# Altium schematic symbol library LATTICEPLDS_Library.SchLib: 291 symbols (part 22 of 32)
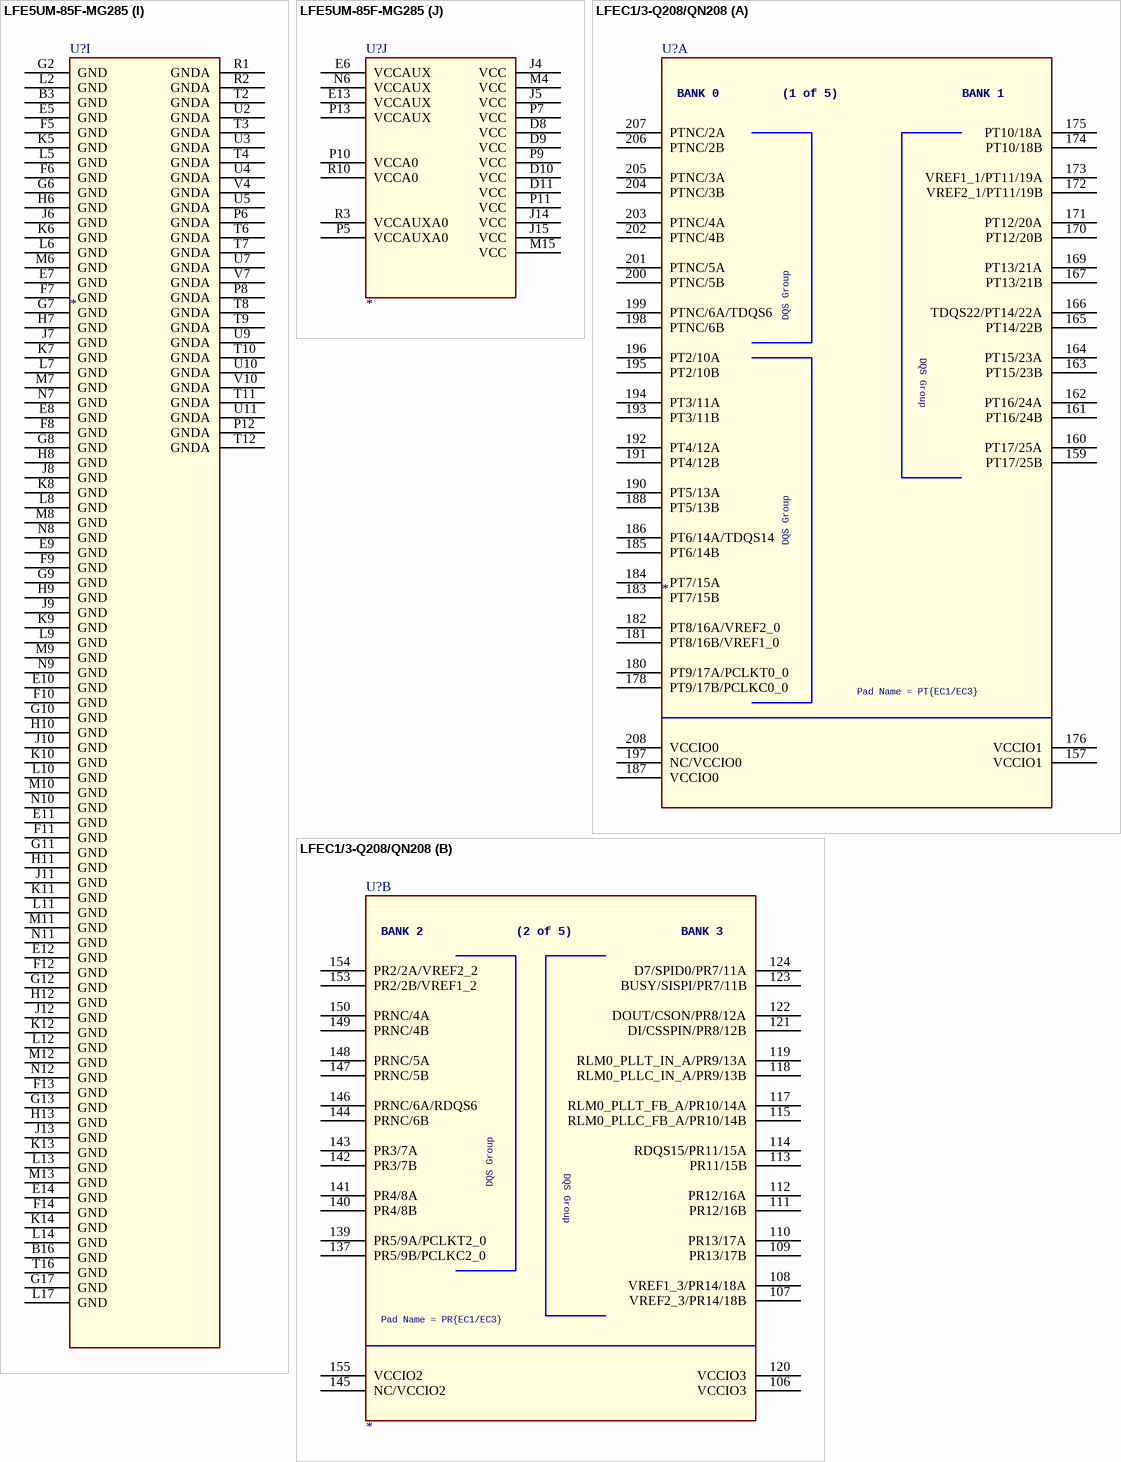
[diagram p324: symbols LFE5UM-85F-MG285 to LFEC1/3-Q208/QN208]

## LFE5UM-85F-MG285
designator U?
SPLIT_INST: TRUE; SWAP_INFO: (S1+S2+S3+S4+S5+S6+S7+S8+S9+S10)
part A pins: A10 PT63B/PCLKC0_1 (io), A11 PT63A/PCLKT0_1 (io), B10 PT65A/PCLKT0_0 (io), B11 PT4A/ULC_GPLL1T_IN (io), C10 PT65B/PCLKC0_0 (io), C11 PT4B/ULC_GPLL1C_IN (io), D12 VCCIO0 (power)
part B pins: A8 PT71B/PCLKC1_0 (io), A9 PT71A/PCLKT1_0 (io), B8 PT121A/URC_GPLL1T_IN (io), B9 PT69A/PCLKT1_1 (io), C8 PT121B/URC_GPLL1C_IN (io), C9 PT69B/PCLKC1_1 (io), D7 VCCIO1 (power)
part C pins: A2 PR41C (io), A3 PR41A (io), A4 PR20B (io), A6 PR20A (io), A7 PR17B (io), B1 PR44B/PCLKC2_1 (io), B2 PR41B (io), B4 PR35C/VREF1_2 (io), B6 PR17A (io), B7 PR11B/URC_GPLL0C_IN (io), C1 PR44C/PCLKT2_0 (io), C2 PR38B (io), C3 PR35D (io), C4 PR35B (io), C6 PR14B (io), C7 PR11A/URC_GPLL0T_IN (io), D1 PR44D/PCLKC2_0 (io), D2 PR44A/PCLKT2_1 (io), D3 PR38A (io), D4 PR35A (io), D6 PR14A (io), G5 VCCIO2 (power), H5 VCCIO2 (power)
part D pins: F1 PR56C (io), F2 PR53A (io), F3 PR47D/PCLKC3_0 (io), F4 PR47C/PCLKT3_0 (io), G1 PR53B (io), G3 PR50B (io), G4 PR47B/PCLKC3_1 (io), H1 PR56D (io), H2 PR50D (io), H3 PR50A (io), H4 PR47A/PCLKT3_1 (io), J1 PR56B/VREF1_3 (io), J2 PR56A (io), J3 PR50C (io), K1 PR86D (io), K2 PR89A (io), K3 PR86C (io), K4 PR83A (io), L1 PR89B (io), L3 PR86B (io), L4 PR83B (io), M1 PR92C/LRC_GPLL0T_IN (io), M2 PR89C (io), M3 PR86A (io), M5 VCCIO3 (power), N1 PR92D/LRC_GPLL0C_IN (io), N2 PR89D (io), N3 PR83D (io), N4 PR83C (io), N5 VCCIO3 (power)
part E pins: C18 PL47B/PCLKC6_1 (io), D17 PL47A/PCLKT6_1 (io), D18 PL47C/PCLKT6_0 (io), F15 PL50C (io), F16 PL50B (io), F17 PL50A (io), F18 PL47D/PCLKC6_0 (io), G15 PL56A (io), G16 PL50D (io), G18 PL53A (io), H15 PL56B/VREF1_6 (io), H16 PL56C (io), H17 PL53B (io), H18 PL83D (io), J16 PL56D (io), J17 PL83C (io), J18 PL86A (io), K15 PL86D (io), K16 PL86C (io), K17 PL89A (io), K18 PL86B (io), L15 PL89C (io), L16 PL89D (io), L18 PL89B (io), M14 VCCIO6 (power), M16 PL92C/LLC_GPLL0T_IN (io), M17 PL92D/LLC_GPLL0C_IN (io), N14 VCCIO6 (power)
part F pins: A12 PL14A (io), A13 PL35B (io), A15 PL35D (io), A16 PL41B (io), A17 PL44A/PCLKT7_1 (io), B12 PL11B (io), B13 PL35A (io), B15 PL41A (io), B17 PL44B/PCLKC7_1 (io), B18 PL44C/PCLKT7_0 (io), C12 PL11A (io), C13 PL17B (io), C15 PL35C/VREF1_7 (io), C16 PL41C (io), C17 PL44D/PCLKC7_0 (io), D13 PL17A (io), D15 PL38A (io), D16 PL38B (io), G14 VCCIO7 (power), H14 VCCIO7 (power)
part G pins: M18 PB6B/D4 (io), N13 VCCIO8 (power), N15 PB4A/D7 (io), N16 PB4B/D6 (io), N17 PB6A/D5 (io), N18 PB9A/D3/IO3 (io), P14 VCCIO8 (power), R16 PB18A/WRITEN (io), R17 PB13A/SN/CSN (io), R18 PB9B/D2/IO2 (io), T13 TDI (io), T14 CFG_1 (io), T15 PROGRAMN (io), T17 PB13B/CS1N (io), T18 PB11A/D1/MISO/IO1 (io), U13 TCK (io), U14 CFG_0 (io), U15 DONE (io), U16 CCLK/MCLK/SCK (io), U17 PB15A/HOLDN/DI/BUSY/CSSPIN/CEN (io), U18 PB11B/D0/MOSI/IO0 (io), V13 TMS (io), V14 TDO (io), V15 CFG_2 (io), V16 INITN (io), V17 PB15B/DOUT/CSON (io)
part H pins: T1 REFCLKN_D0 (power), T5 VCCHTX1_D0CH1 (power), U1 REFCLKP_D0 (power), U6 VCCHRX1_D0CH1 (power), U8 VCCHRX0_D0CH0 (power), U12 VCCHTX0_D0CH0 (power), V2 HDTXN0_D0CH1 (power), V3 HDTXP0_D0CH1 (power), V5 HDRXN0_D0CH1 (power), V6 HDRXP0_D0CH1 (power), V8 HDRXN0_D0CH0 (power), V9 HDRXP0_D0CH0 (power), V11 HDTXN0_D0CH0 (power), V12 HDTXP0_D0CH0 (power)
part I pins: B3 GND (power), B16 GND (power), E5 GND (power), E7 GND (power), E8 GND (power), E9 GND (power), E10 GND (power), E11 GND (power), E12 GND (power), E14 GND (power), F5 GND (power), F6 GND (power), F7 GND (power), F8 GND (power), F9 GND (power), F10 GND (power), F11 GND (power), F12 GND (power), F13 GND (power), F14 GND (power), G2 GND (power), G6 GND (power), G7 GND (power), G8 GND (power), G9 GND (power), G10 GND (power), G11 GND (power), G12 GND (power), G13 GND (power), G17 GND (power), H6 GND (power), H7 GND (power), H8 GND (power), H9 GND (power), H10 GND (power), H11 GND (power), H12 GND (power), H13 GND (power), J6 GND (power), J7 GND (power), J8 GND (power), J9 GND (power), J10 GND (power), J11 GND (power), J12 GND (power), J13 GND (power), K5 GND (power), K6 GND (power), K7 GND (power), K8 GND (power), K9 GND (power), K10 GND (power), K11 GND (power), K12 GND (power), K13 GND (power), K14 GND (power), L2 GND (power), L5 GND (power), L6 GND (power), L7 GND (power), L8 GND (power), L9 GND (power), L10 GND (power), L11 GND (power), L12 GND (power), L13 GND (power), L14 GND (power), L17 GND (power), M6 GND (power), M7 GND (power), M8 GND (power), M9 GND (power), M10 GND (power), M11 GND (power), M12 GND (power), M13 GND (power), N7 GND (power), N8 GND (power), N9 GND (power), N10 GND (power), N11 GND (power), N12 GND (power), P6 GNDA (power), P8 GNDA (power), P12 GNDA (power), R1 GNDA (power), R2 GNDA (power), T2 GNDA (power), T3 GNDA (power), T4 GNDA (power), T6 GNDA (power), T7 GNDA (power), T8 GNDA (power), T9 GNDA (power), T10 GNDA (power), T11 GNDA (power), T12 GNDA (power), T16 GND (power), U2 GNDA (power), U3 GNDA (power), U4 GNDA (power), U5 GNDA (power), U7 GNDA (power), U9 GNDA (power), U10 GNDA (power), U11 GNDA (power), V4 GNDA (power), V7 GNDA (power), V10 GNDA (power)
part J pins: D8 VCC (power), D9 VCC (power), D10 VCC (power), D11 VCC (power), E6 VCCAUX (power), E13 VCCAUX (power), J4 VCC (power), J5 VCC (power), J14 VCC (power), J15 VCC (power), M4 VCC (power), M15 VCC (power), N6 VCCAUX (power), P5 VCCAUXA0 (power), P7 VCC (power), P9 VCC (power), P10 VCCA0 (power), P11 VCC (power), P13 VCCAUX (power), R3 VCCAUXA0 (power), R10 VCCA0 (power)

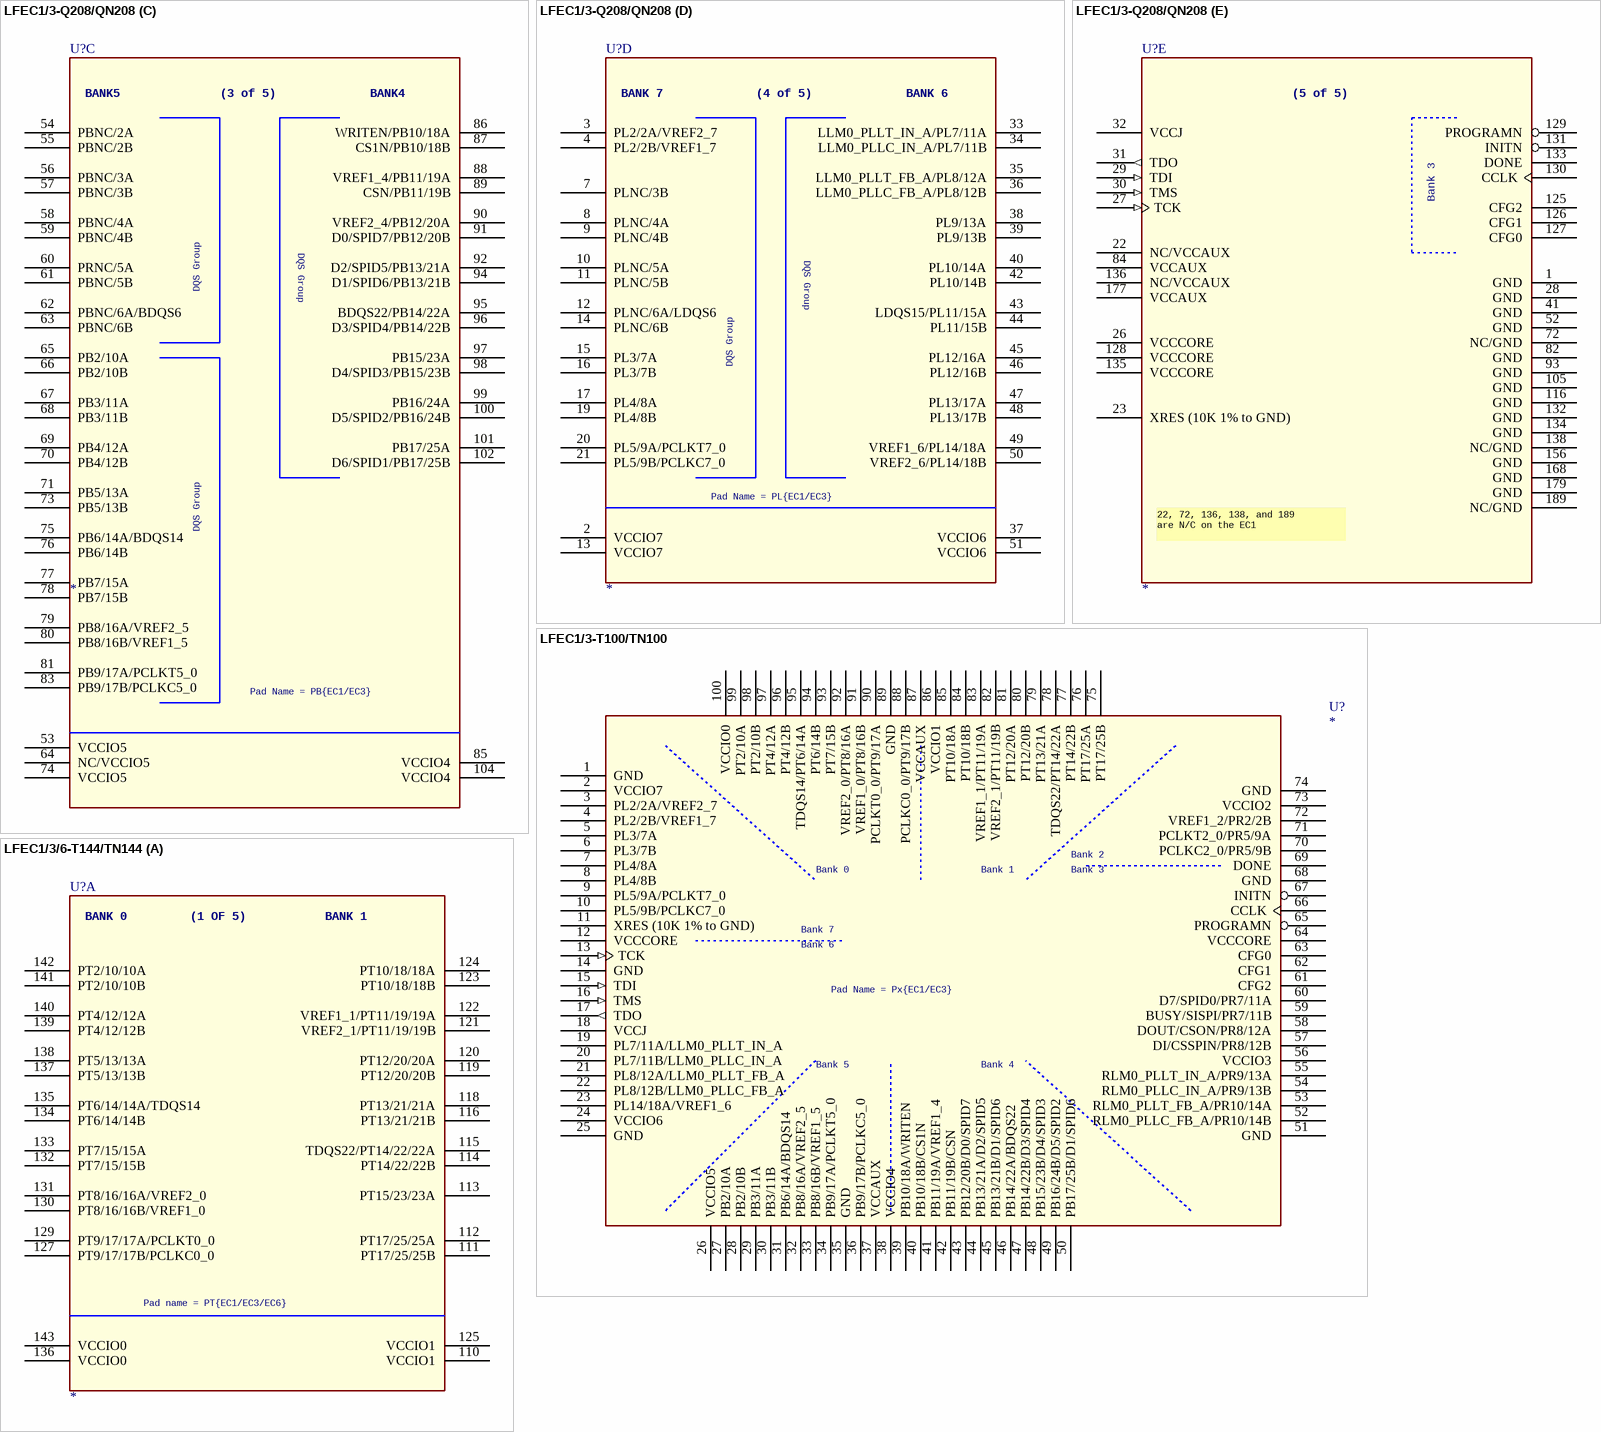
[diagram p206: symbols LFEC1/3-Q208/QN208 to LFEC1/3/6-T144/TN144]

## LFEC1/3-Q208/QN208
designator U?
footprint 208PQFP
part A pins: 157 VCCIO1 (power), 159 PT17/25B, 160 PT17/25A, 161 PT16/24B, 162 PT16/24A, 163 PT15/23B, 164 PT15/23A, 165 PT14/22B, 166 TDQS22/PT14/22A, 167 PT13/21B, 169 PT13/21A, 170 PT12/20B, 171 PT12/20A, 172 VREF2_1/PT11/19B, 173 VREF1_1/PT11/19A, 174 PT10/18B, 175 PT10/18A, 176 VCCIO1 (power), 178 PT9/17B/PCLKC0_0, 180 PT9/17A/PCLKT0_0, 181 PT8/16B/VREF1_0, 182 PT8/16A/VREF2_0, 183 PT7/15B, 184 PT7/15A, 185 PT6/14B, 186 PT6/14A/TDQS14, 187 VCCIO0 (power), 188 PT5/13B, 190 PT5/13A, 191 PT4/12B, 192 PT4/12A, 193 PT3/11B, 194 PT3/11A, 195 PT2/10B, 196 PT2/10A, 197 NC/VCCIO0 (power), 198 PTNC/6B, 199 PTNC/6A/TDQS6, 200 PTNC/5B, 201 PTNC/5A, 202 PTNC/4B, 203 PTNC/4A, 204 PTNC/3B, 205 PTNC/3A, 206 PTNC/2B, 207 PTNC/2A, 208 VCCIO0 (power)
part B pins: 106 VCCIO3 (power), 107 VREF2_3/PR14/18B, 108 VREF1_3/PR14/18A, 109 PR13/17B, 110 PR13/17A, 111 PR12/16B, 112 PR12/16A, 113 PR11/15B, 114 RDQS15/PR11/15A, 115 RLM0_PLLC_FB_A/PR10/14B, 117 RLM0_PLLT_FB_A/PR10/14A, 118 RLM0_PLLC_IN_A/PR9/13B, 119 RLM0_PLLT_IN_A/PR9/13A, 120 VCCIO3 (power), 121 DI/CSSPIN/PR8/12B, 122 DOUT/CSON/PR8/12A, 123 BUSY/SISPI/PR7/11B, 124 D7/SPID0/PR7/11A, 137 PR5/9B/PCLKC2_0, 139 PR5/9A/PCLKT2_0, 140 PR4/8B, 141 PR4/8A, 142 PR3/7B, 143 PR3/7A, 144 PRNC/6B, 145 NC/VCCIO2 (power), 146 PRNC/6A/RDQS6, 147 PRNC/5B, 148 PRNC/5A, 149 PRNC/4B, 150 PRNC/4A, 153 PR2/2B/VREF1_2, 154 PR2/2A/VREF2_2, 155 VCCIO2 (power)
part C pins: 53 VCCIO5 (power), 54 PBNC/2A, 55 PBNC/2B, 56 PBNC/3A, 57 PBNC/3B, 58 PBNC/4A, 59 PBNC/4B, 60 PRNC/5A, 61 PBNC/5B, 62 PBNC/6A/BDQS6, 63 PBNC/6B, 64 NC/VCCIO5 (power), 65 PB2/10A, 66 PB2/10B, 67 PB3/11A, 68 PB3/11B, 69 PB4/12A, 70 PB4/12B, 71 PB5/13A, 73 PB5/13B, 74 VCCIO5 (power), 75 PB6/14A/BDQS14, 76 PB6/14B, 77 PB7/15A, 78 PB7/15B, 79 PB8/16A/VREF2_5, 80 PB8/16B/VREF1_5, 81 PB9/17A/PCLKT5_0, 83 PB9/17B/PCLKC5_0, 85 VCCIO4 (power), 86 WRITEN/PB10/18A, 87 CS1N/PB10/18B, 88 VREF1_4/PB11/19A, 89 CSN/PB11/19B, 90 VREF2_4/PB12/20A, 91 D0/SPID7/PB12/20B, 92 D2/SPID5/PB13/21A, 94 D1/SPID6/PB13/21B, 95 BDQS22/PB14/22A, 96 D3/SPID4/PB14/22B, 97 PB15/23A, 98 D4/SPID3/PB15/23B, 99 PB16/24A, 100 D5/SPID2/PB16/24B, 101 PB17/25A, 102 D6/SPID1/PB17/25B, 104 VCCIO4 (power)
part D pins: 2 VCCIO7 (power), 3 PL2/2A/VREF2_7, 4 PL2/2B/VREF1_7, 7 PLNC/3B, 8 PLNC/4A, 9 PLNC/4B, 10 PLNC/5A, 11 PLNC/5B, 12 PLNC/6A/LDQS6, 13 VCCIO7 (power), 14 PLNC/6B, 15 PL3/7A, 16 PL3/7B, 17 PL4/8A, 19 PL4/8B, 20 PL5/9A/PCLKT7_0, 21 PL5/9B/PCLKC7_0, 33 LLM0_PLLT_IN_A/PL7/11A, 34 LLM0_PLLC_IN_A/PL7/11B, 35 LLM0_PLLT_FB_A/PL8/12A, 36 LLM0_PLLC_FB_A/PL8/12B, 37 VCCIO6 (power), 38 PL9/13A, 39 PL9/13B, 40 PL10/14A, 42 PL10/14B, 43 LDQS15/PL11/15A, 44 PL11/15B, 45 PL12/16A, 46 PL12/16B, 47 PL13/17A, 48 PL13/17B, 49 VREF1_6/PL14/18A, 50 VREF2_6/PL14/18B, 51 VCCIO6 (power)
part E pins: 1 GND (power), 22 NC/VCCAUX (power), 23 XRES (10K 1% to GND), 26 VCCCORE (power), 27 TCK (in), 28 GND (power), 29 TDI (in), 30 TMS (in), 31 TDO (out), 32 VCCJ (power), 41 GND (power), 52 GND (power), 72 NC/GND (power), 82 GND (power), 84 VCCAUX (power), 93 GND (power), 105 GND (power), 116 GND (power), 125 CFG2, 126 CFG1, 127 CFG0, 128 VCCCORE (power), 129 PROGRAMN, 130 CCLK, 131 INITN, 132 GND (power), 133 DONE, 134 GND (power), 135 VCCCORE (power), 136 NC/VCCAUX (power), 138 NC/GND (power), 156 GND (power), 168 GND (power), 177 VCCAUX (power), 179 GND (power), 189 NC/GND (power)
part A text: BANK 0; (1 of 5); BANK 1; DQS Group; Pad Name = PT{EC1/EC3}
part B text: BANK 2; (2 of 5); BANK 3; DQS Group; Pad Name = PR{EC1/EC3}
part C text: BANK5; (3 of 5); BANK4; DQS Group; Pad Name = PB{EC1/EC3}
part D text: BANK 7; (4 of 5); BANK 6; DQS Group; Pad Name = PL{EC1/EC3}
part E text: (5 of 5); Bank 3; 22, 72, 136, 138, and 189 / are N/C on the EC1

## LFEC1/3-T100/TN100
designator U?
footprint TQFP100
pins: 1 GND (power), 2 VCCIO7 (power), 3 PL2/2A/VREF2_7, 4 PL2/2B/VREF1_7, 5 PL3/7A, 6 PL3/7B, 7 PL4/8A, 8 PL4/8B, 9 PL5/9A/PCLKT7_0, 10 PL5/9B/PCLKC7_0, 11 XRES (10K 1% to GND), 12 VCCCORE (power), 13 TCK (in), 14 GND (power), 15 TDI (in), 16 TMS (in), 17 TDO (out), 18 VCCJ (power), 19 PL7/11A/LLM0_PLLT_IN_A, 20 PL7/11B/LLM0_PLLC_IN_A, 21 PL8/12A/LLM0_PLLT_FB_A, 22 PL8/12B/LLM0_PLLC_FB_A, 23 PL14/18A/VREF1_6, 24 VCCIO6 (power), 25 GND (power), 26 VCCIO5 (power), 27 PB2/10A, 28 PB2/10B, 29 PB3/11A, 30 PB3/11B, 31 PB6/14A/BDQS14, 32 PB8/16A/VREF2_5, 33 PB8/16B/VREF1_5, 34 PB9/17A/PCLKT5_0, 35 GND (power), 36 PB9/17B/PCLKC5_0, 37 VCCAUX (power), 38 VCCIO4 (power), 39 PB10/18A/WRITEN, 40 PB10/18B/CS1N, 41 PB11/19A/VREF1_4, 42 PB11/19B/CSN, 43 PB12/20B/D0/SPID7, 44 PB13/21A/D2/SPID5, 45 PB13/21B/D1/SPID6, 46 PB14/22A/BDQS22, 47 PB14/22B/D3/SPID4, 48 PB15/23B/D4/SPID3, 49 PB16/24B/D5/SPID2, 50 PB17/25B/D1/SPID6, 51 GND (power), 52 RLM0_PLLC_FB_A/PR10/14B, 53 RLM0_PLLT_FB_A/PR10/14A, 54 RLM0_PLLC_IN_A/PR9/13B, 55 RLM0_PLLT_IN_A/PR9/13A, 56 VCCIO3 (power), 57 DI/CSSPIN/PR8/12B, 58 DOUT/CSON/PR8/12A, 59 BUSY/SISPI/PR7/11B, 60 D7/SPID0/PR7/11A, 61 CFG2, 62 CFG1, 63 CFG0, 64 VCCCORE (power), 65 PROGRAMN, 66 CCLK, 67 INITN, 68 GND (power), 69 DONE, 70 PCLKC2_0/PR5/9B, 71 PCLKT2_0/PR5/9A, 72 VREF1_2/PR2/2B, 73 VCCIO2 (power), 74 GND (power), 75 PT17/25B, 76 PT17/25A, 77 PT14/22B, 78 TDQS22/PT14/22A, 79 PT13/21A, 80 PT12/20B, 81 PT12/20A, 82 VREF2_1/PT11/19B, 83 VREF1_1/PT11/19A, 84 PT10/18B, 85 PT10/18A, 86 VCCIO1 (power), 87 VCCAUX (power), 88 PCLKC0_0/PT9/17B, 89 GND (power), 90 PCLKT0_0/PT9/17A, 91 VREF1_0/PT8/16B, 92 VREF2_0/PT8/16A, 93 PT7/15B, 94 PT6/14B, 95 TDQS14/PT6/14A, 96 PT4/12B, 97 PT4/12A, 98 PT2/10B, 99 PT2/10A, 100 VCCIO0 (power)
text: Bank 2; Bank 0; Bank 1; Bank 3; Bank 7; Bank 6; Pad Name = Px{EC1/EC3}; Bank 5; Bank 4

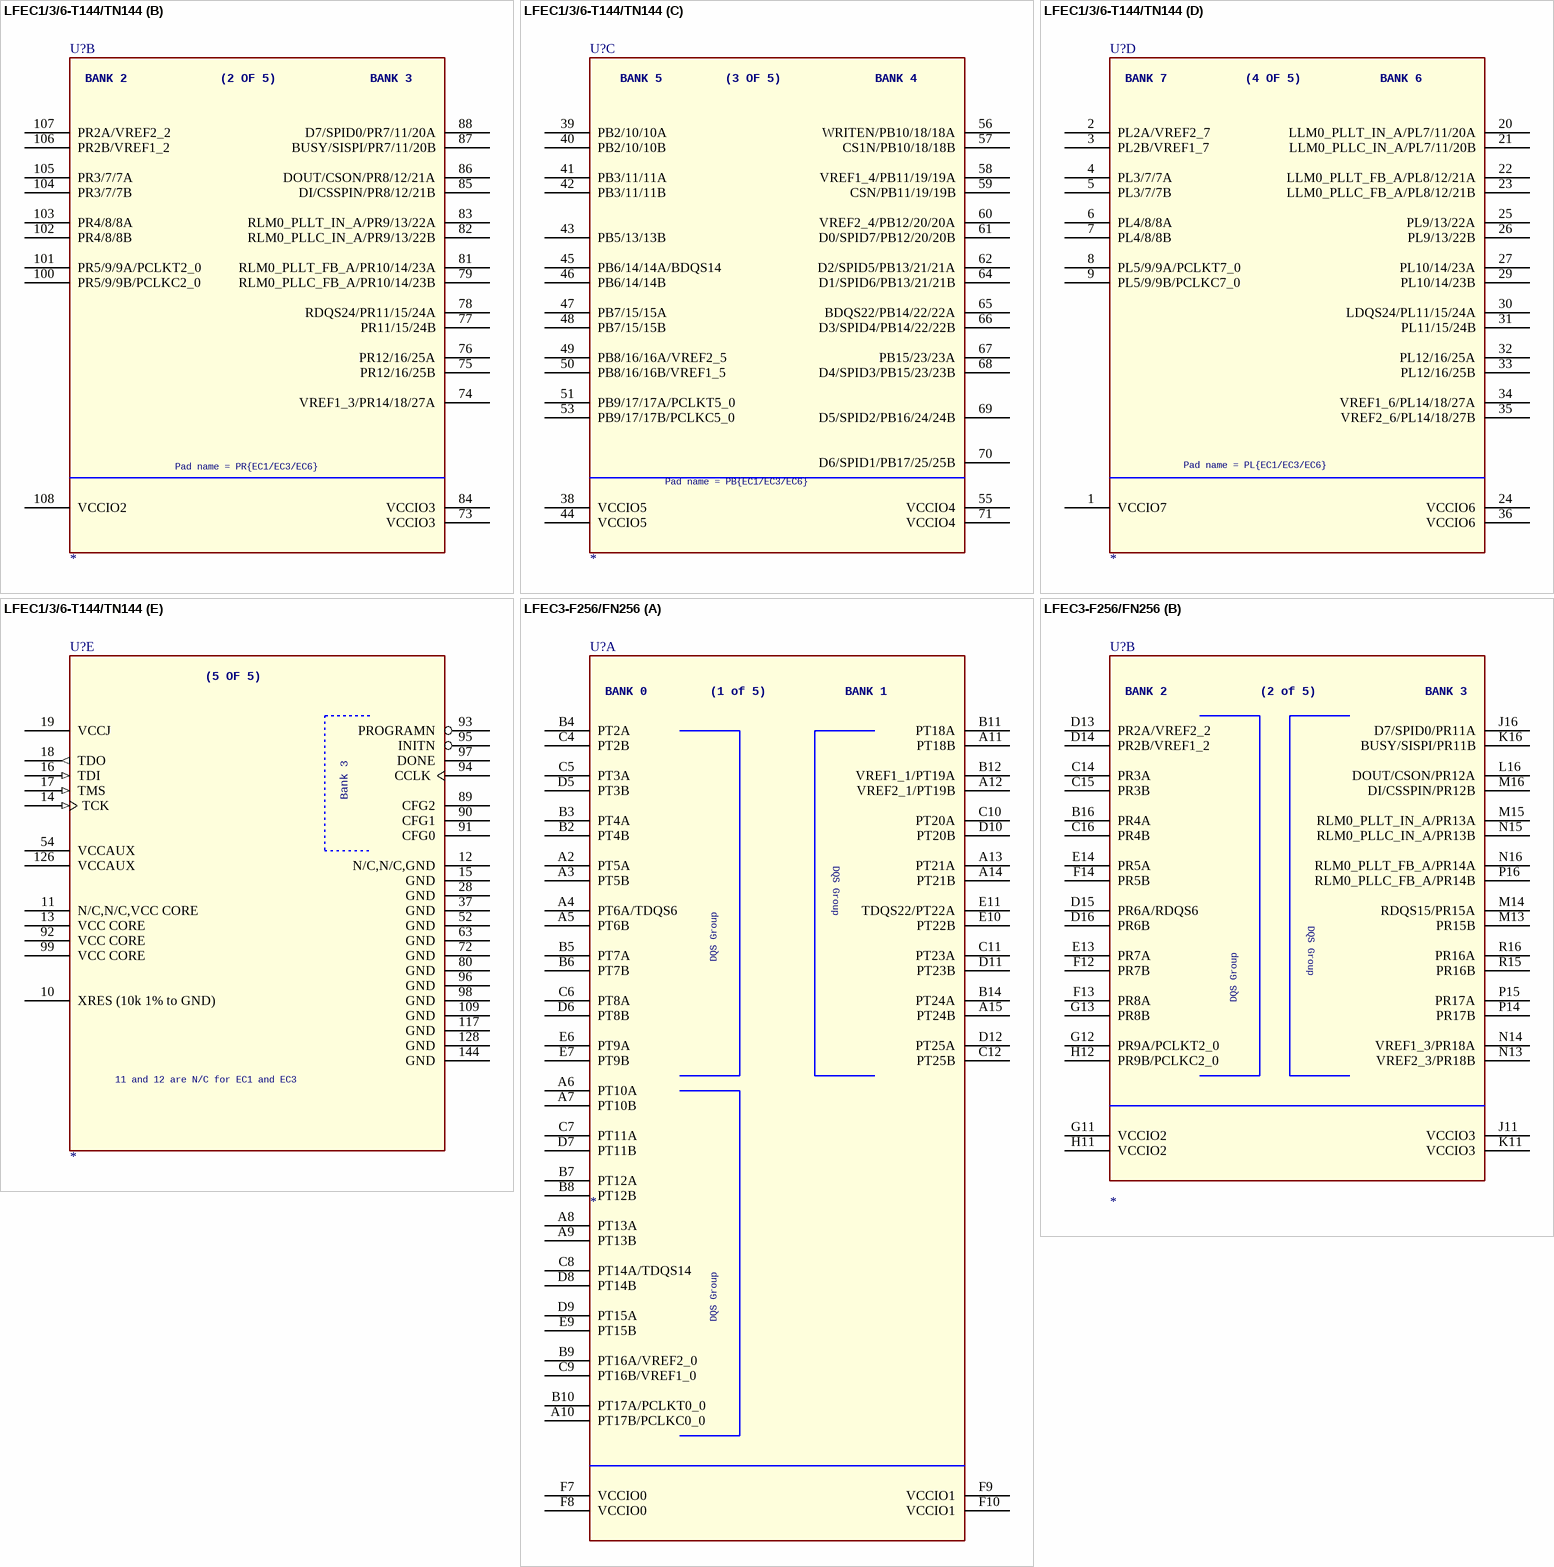
[diagram p207: symbols LFEC1/3/6-T144/TN144 to LFEC3-F256/FN256]

## LFEC1/3/6-T144/TN144
designator U?
footprint TQFP144
part A pins: 110 VCCIO1 (power), 111 PT17/25/25B, 112 PT17/25/25A, 113 PT15/23/23A, 114 PT14/22/22B, 115 TDQS22/PT14/22/22A, 116 PT13/21/21B, 118 PT13/21/21A, 119 PT12/20/20B, 120 PT12/20/20A, 121 VREF2_1/PT11/19/19B, 122 VREF1_1/PT11/19/19A, 123 PT10/18/18B, 124 PT10/18/18A, 125 VCCIO1 (power), 127 PT9/17/17B/PCLKC0_0, 129 PT9/17/17A/PCLKT0_0, 130 PT8/16/16B/VREF1_0, 131 PT8/16/16A/VREF2_0, 132 PT7/15/15B, 133 PT7/15/15A, 134 PT6/14/14B, 135 PT6/14/14A/TDQS14, 136 VCCIO0 (power), 137 PT5/13/13B, 138 PT5/13/13A, 139 PT4/12/12B, 140 PT4/12/12A, 141 PT2/10/10B, 142 PT2/10/10A, 143 VCCIO0 (power)
part B pins: 73 VCCIO3 (power), 74 VREF1_3/PR14/18/27A, 75 PR12/16/25B, 76 PR12/16/25A, 77 PR11/15/24B, 78 RDQS24/PR11/15/24A, 79 RLM0_PLLC_FB_A/PR10/14/23B, 81 RLM0_PLLT_FB_A/PR10/14/23A, 82 RLM0_PLLC_IN_A/PR9/13/22B, 83 RLM0_PLLT_IN_A/PR9/13/22A, 84 VCCIO3 (power), 85 DI/CSSPIN/PR8/12/21B, 86 DOUT/CSON/PR8/12/21A, 87 BUSY/SISPI/PR7/11/20B, 88 D7/SPID0/PR7/11/20A, 100 PR5/9/9B/PCLKC2_0, 101 PR5/9/9A/PCLKT2_0, 102 PR4/8/8B, 103 PR4/8/8A, 104 PR3/7/7B, 105 PR3/7/7A, 106 PR2B/VREF1_2, 107 PR2A/VREF2_2, 108 VCCIO2 (power)
part C pins: 38 VCCIO5 (power), 39 PB2/10/10A, 40 PB2/10/10B, 41 PB3/11/11A, 42 PB3/11/11B, 43 PB5/13/13B, 44 VCCIO5 (power), 45 PB6/14/14A/BDQS14, 46 PB6/14/14B, 47 PB7/15/15A, 48 PB7/15/15B, 49 PB8/16/16A/VREF2_5, 50 PB8/16/16B/VREF1_5, 51 PB9/17/17A/PCLKT5_0, 53 PB9/17/17B/PCLKC5_0, 55 VCCIO4 (power), 56 WRITEN/PB10/18/18A, 57 CS1N/PB10/18/18B, 58 VREF1_4/PB11/19/19A, 59 CSN/PB11/19/19B, 60 VREF2_4/PB12/20/20A, 61 D0/SPID7/PB12/20/20B, 62 D2/SPID5/PB13/21/21A, 64 D1/SPID6/PB13/21/21B, 65 BDQS22/PB14/22/22A, 66 D3/SPID4/PB14/22/22B, 67 PB15/23/23A, 68 D4/SPID3/PB15/23/23B, 69 D5/SPID2/PB16/24/24B, 70 D6/SPID1/PB17/25/25B, 71 VCCIO4 (power)
part D pins: 1 VCCIO7 (power), 2 PL2A/VREF2_7, 3 PL2B/VREF1_7, 4 PL3/7/7A, 5 PL3/7/7B, 6 PL4/8/8A, 7 PL4/8/8B, 8 PL5/9/9A/PCLKT7_0, 9 PL5/9/9B/PCLKC7_0, 20 LLM0_PLLT_IN_A/PL7/11/20A, 21 LLM0_PLLC_IN_A/PL7/11/20B, 22 LLM0_PLLT_FB_A/PL8/12/21A, 23 LLM0_PLLC_FB_A/PL8/12/21B, 24 VCCIO6 (power), 25 PL9/13/22A, 26 PL9/13/22B, 27 PL10/14/23A, 29 PL10/14/23B, 30 LDQS24/PL11/15/24A, 31 PL11/15/24B, 32 PL12/16/25A, 33 PL12/16/25B, 34 VREF1_6/PL14/18/27A, 35 VREF2_6/PL14/18/27B, 36 VCCIO6 (power)
part E pins: 10 XRES (10k 1% to GND) (power), 11 N/C,N/C,VCC CORE (power), 12 N/C,N/C,GND (power), 13 VCC CORE (power), 14 TCK (in), 15 GND (power), 16 TDI (in), 17 TMS (in), 18 TDO (out), 19 VCCJ (power), 28 GND (power), 37 GND (power), 52 GND (power), 54 VCCAUX (power), 63 GND (power), 72 GND (power), 80 GND (power), 89 CFG2, 90 CFG1, 91 CFG0, 92 VCC CORE (power), 93 PROGRAMN, 94 CCLK, 95 INITN, 96 GND (power), 97 DONE, 98 GND (power), 99 VCC CORE (power), 109 GND (power), 117 GND (power), 126 VCCAUX (power), 128 GND (power), 144 GND (power)
